# Altium footprint library 13-IC Packages-2smt2e.PcbLib: 86 footprints (part 4 of 6)
Each footprint in its own frame and in the unit in brackets; x right, y up, seen from the top. Pads: shape width x height; smd on the part's side, far side on the other; paste and mask are expansions set on the pad; w line width, h text height; cw(c..) or ccw(c..) is an arc to the next point about the centre after c.
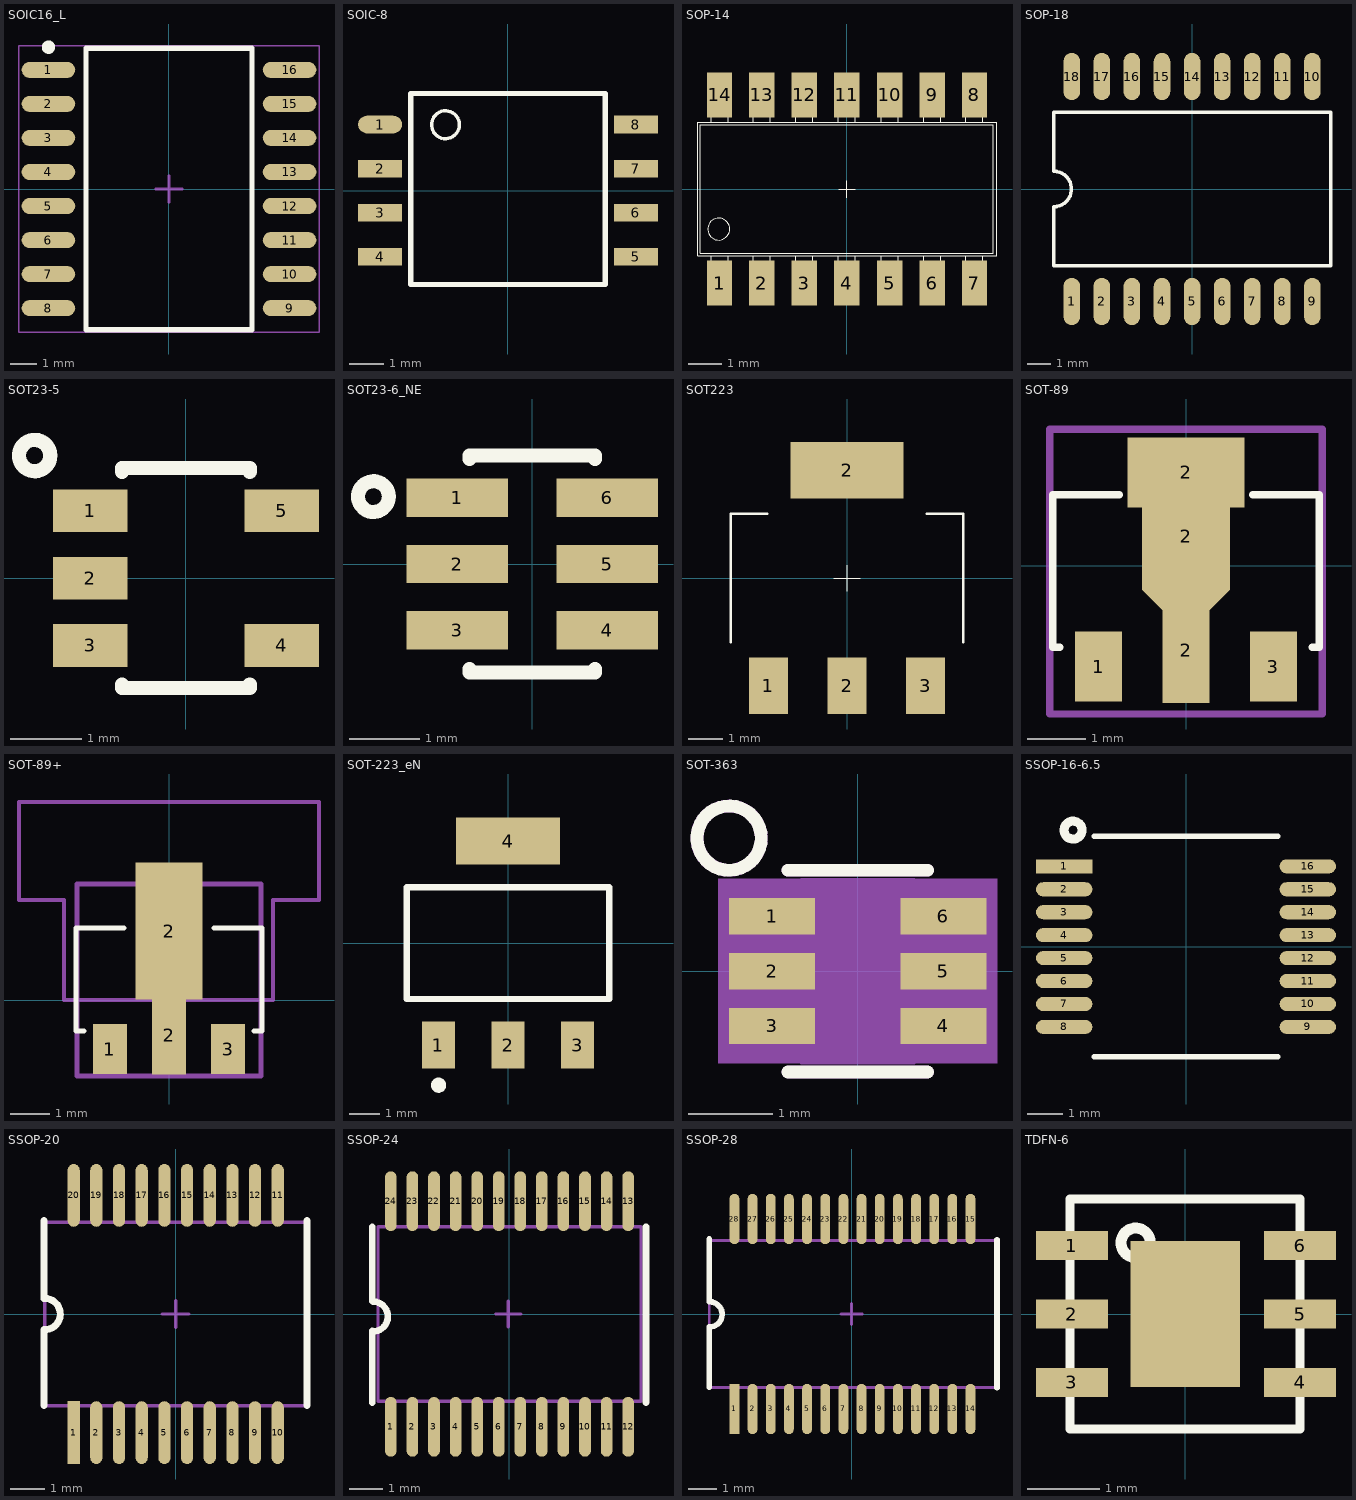
[diagram p3: the footprints below, top view; thin cyan lines are the x and y axes]

## SOIC16_L [mm]
pads (16):
  oval 2x0.6 smd: 1(-4.5,4.445) 2(-4.5,3.175) 3(-4.5,1.905) 4(-4.5,0.635) 5(-4.5,-0.635) 6(-4.5,-1.905) 7(-4.5,-3.175) 8(-4.5,-4.445) 9(4.5,-4.445) 10(4.5,-3.175) 11(4.5,-1.905) 12(4.5,-0.635) 13(4.5,0.635) 14(4.5,1.905) 15(4.5,3.175) 16(4.5,4.445)
Top Overlay:
  circle w0.25: c-4.5,5.295 r0.125
  lines w0.2: -3.1,-5.25 -3.1,5.25 3.1,5.25 3.1,-5.25 -3.1,-5.25
Mechanical 15:
  lines w0.05: -5.6,-5.35 -5.6,5.35 5.6,5.35 5.6,-5.35 -5.6,-5.35
  lines w0.1: -0.5,0 0.5,0 ; 0,-0.5 0,0.5
3D body "0_6-2_0.stp": height 0.02, standoff 0, extent 3.5,4.145 5.5,4.745
3D body "0_6-2_0.stp": height 0.02, standoff 0, extent 3.5,2.875 5.5,3.475
3D body "0_6-2_0.stp": height 0.02, standoff 0, extent 3.5,1.605 5.5,2.205
3D body "0_6-2_0.stp": height 0.02, standoff 0, extent 3.5,0.335 5.5,0.935
3D body "0_6-2_0.stp": height 0.02, standoff 0, extent 3.5,-0.935 5.5,-0.335
3D body "0_6-2_0.stp": height 0.02, standoff 0, extent 3.5,-2.205 5.5,-1.605
3D body "0_6-2_0.stp": height 0.02, standoff 0, extent 3.5,-3.475 5.5,-2.875
3D body "0_6-2_0.stp": height 0.02, standoff 0, extent 3.5,-4.745 5.5,-4.145
3D body "0_6-2_0.stp": height 0.02, standoff 0, extent -5.5,-4.745 -3.5,-4.145
3D body "0_6-2_0.stp": height 0.02, standoff 0, extent -5.5,-3.475 -3.5,-2.875
3D body "0_6-2_0.stp": height 0.02, standoff 0, extent -5.5,-2.205 -3.5,-1.605
3D body "0_6-2_0.stp": height 0.02, standoff 0, extent -5.5,-0.935 -3.5,-0.335
3D body "0_6-2_0.stp": height 0.02, standoff 0, extent -5.5,0.335 -3.5,0.935
3D body "0_6-2_0.stp": height 0.02, standoff 0, extent -5.5,1.605 -3.5,2.205
3D body "0_6-2_0.stp": height 0.02, standoff 0, extent -5.5,2.875 -3.5,3.475
3D body "0_6-2_0.stp": height 0.02, standoff 0, extent -5.5,4.145 -3.5,4.745
3D body "sop-16.stp": height 1.5, standoff 0, extent -4.067,-5 4.067,5

## SOIC-8 [mil]
pads (8):
  oval 50x20 smd mask+2: 1(-145,75)
  rect 50x20 smd mask+2: 2(-145,25) 3(-145,-25) 5(145,-75) 6(145,-25) 7(145,25) 8(145,75)
  rect 50x20 smd mask+0: 4(-145,-75)
Top Overlay:
  circle w3.94: c-70.87,74.8 r15.75
  lines w6: -110.24,-106.3 110.24,-106.3 110.24,110.24 -73.77,110.24 -110.24,110.24 -110.24,-106.3
3D body "soic-8.stp": height 68.9, standoff 0, extent -149.61,-99.61 153.54,102.36

## SOP-14 [mm]
pads (14):
  rect 0.76x1.35 smd mask+0.051: 1(-3.82,-2.819) 2(-2.55,-2.819) 3(-1.28,-2.819) 4(-0.01,-2.819) 5(1.28,-2.819) 6(2.55,-2.819) 7(3.82,-2.819) 8(3.82,2.819) 9(2.55,2.819) 10(1.28,2.819) 11(-0.01,2.819) 12(-1.28,2.819) 13(-2.55,2.819) 14(-3.82,2.819)
Top Overlay:
  circle w0.025: c-3.845,-1.2 r0.33
  lines w0.003: -0.249,0 0.244,0 ; 0,-0.269 0,0.244
  lines w0.025: -4.074,-2.591 -3.566,-2.591 ; -4.074,-2.007 -4.074,-3.099 -3.566,-3.099 -3.566,-2.007 ; -4.074,2.007 -4.074,3.099 -3.566,3.099 -3.566,2.007 ; -4.074,2.591 -3.566,2.591 ; -2.804,-2.591 -2.296,-2.591 ; -2.804,-2.007 -2.804,-3.099 -2.296,-3.099 -2.296,-2.007 ; -2.804,2.007 -2.804,3.099 -2.296,3.099 -2.296,2.007 ; -2.804,2.591 -2.296,2.591 ; -1.534,-2.591 -1.026,-2.591 ; -1.534,-2.007 -1.534,-3.099 -1.026,-3.099 -1.026,-2.007 ; -1.534,2.007 -1.534,3.099 -1.026,3.099 -1.026,2.007 ; -1.534,2.591 -1.026,2.591 ; -0.264,-2.591 0.244,-2.591 ; -0.264,-2.007 -0.264,-3.099 0.244,-3.099 0.244,-2.007 ; -0.264,2.019 -0.264,3.111 0.244,3.111 0.244,2.019 ; -0.264,2.603 0.244,2.603 ; 0.632,-2.007 4.485,-2.007 4.485,2.007 0.632,2.007 ; 0.638,-2.007 -4.468,-2.007 -4.468,2.007 0.638,2.007 ; 1.026,-2.591 1.534,-2.591 ; 1.026,-2.007 1.026,-3.099 1.534,-3.099 1.534,-2.007 ; 1.026,2.007 1.026,3.099 1.534,3.099 1.534,2.007 ; 1.026,2.591 1.534,2.591 ; 2.296,-2.591 2.804,-2.591 ; 2.296,-2.007 2.296,-3.099 2.804,-3.099 2.804,-2.007 ; 2.296,2.007 2.296,3.099 2.804,3.099 2.804,2.007 ; 2.296,2.591 2.804,2.591 ; 3.566,-2.591 4.074,-2.591 ; 3.566,-2.007 3.566,-3.099 4.074,-3.099 4.074,-2.007 ; 3.566,2.007 3.566,3.099 4.074,3.099 4.074,2.007 ; 3.566,2.591 4.074,2.591 ; -4.391,-1.93 -4.391,1.93 0.708,1.93 4.385,1.93 4.385,-1.93 0.562,-1.93 -4.391,-1.93
3D body "sop-14.stp": height 1.5, standoff -0.08, extent -4.315,-3.1 4.385,3.112

## SOP-18 [mm]
pads (18):
  oval 0.7x2 smd: 1(-5.08,-4.75) 2(-3.81,-4.75) 3(-2.54,-4.75) 4(-1.27,-4.75) 5(0,-4.75) 6(1.27,-4.75) 7(2.54,-4.75) 8(3.81,-4.75) 9(5.08,-4.75) 10(5.08,4.75) 11(3.81,4.75) 12(2.54,4.75) 13(1.27,4.75) 14(0,4.75) 15(-1.27,4.75) 16(-2.54,4.75) 17(-3.81,4.75) 18(-5.08,4.75)
Top Overlay:
  lines w0.15: -5.842,-3.25 -5.842,-0.75 ccw(c-5.842,0) -5.842,0.75 -5.842,3.25 5.867,3.25 5.867,-3.25 -5.842,-3.25
3D body "sop-18.stp": height 2.36, standoff -0.03, extent -5.677,-4.995 5.677,4.996

## SOT23-5 [mm]
pads (5):
  rect 1.05x0.6 smd mask+0.07: 1(-1.35,0.95) 2(-1.35,0) 3(-1.35,-0.95) 4(1.35,-0.95) 5(1.35,0.95)
Top Overlay:
  circle w0.2: c-2.134,1.727 r0.22
  lines w0.2: -0.9,-1.5 -0.9,-1.55 0.9,-1.55 0.9,-1.5 ; -0.9,1.5 -0.9,1.55 0.9,1.55 0.9,1.5
3D body "0_55-1_45.stp": height 0.02, standoff 0, extent 0.35,0.675 1.8,1.225
3D body "0_55-1_45.stp": height 0.02, standoff 0, extent 0.35,-1.225 1.8,-0.675
3D body "0_55-1_45.stp": height 0.02, standoff 0, extent -1.8,-1.225 -0.35,-0.675
3D body "0_55-1_45.stp": height 0.02, standoff 0, extent -1.8,-0.275 -0.35,0.275
3D body "0_55-1_45.stp": height 0.02, standoff 0, extent -1.8,0.675 -0.35,1.225
3D body "tsot-23-5.stp": height 1, standoff 0.01, extent -1.475,-1.45 1.475,1.45

## SOT23-6_NE [mm]
pads (6):
  rect 1.45x0.55 smd: 1(-1.075,0.95)
  rect 1.45x0.55 smd mask+0.07: 2(-1.075,0) 3(-1.075,-0.95) 4(1.075,-0.95) 5(1.075,0) 6(1.075,0.95)
Top Overlay:
  circle w0.2: c-2.274,0.965 r0.22
  lines w0.2: -0.9,-1.5 -0.9,-1.55 0.9,-1.55 0.9,-1.5 ; -0.9,1.5 -0.9,1.55 0.9,1.55 0.9,1.5
3D body "smd6.stp": height 1.1, standoff 0, extent -1.4,-1.45 1.4,1.45
3D body "0_55-1_45.stp": height 0.02, standoff 0, extent -1.8,0.675 -0.35,1.225
3D body "0_55-1_45.stp": height 0.02, standoff 0, extent -1.8,-0.275 -0.35,0.275
3D body "0_55-1_45.stp": height 0.02, standoff 0, extent -1.8,-1.225 -0.35,-0.675
3D body "0_55-1_45.stp": height 0.02, standoff 0, extent 0.35,-1.225 1.8,-0.675
3D body "0_55-1_45.stp": height 0.02, standoff 0, extent 0.35,-0.275 1.8,0.275
3D body "0_55-1_45.stp": height 0.02, standoff 0, extent 0.35,0.675 1.8,1.225

## SOT223 [mm]
height 1
pads (4):
  rect 1.14x1.65 smd mask+0.051: 1(-2.3,-3.15) 2(0,-3.15) 3(2.3,-3.15)
  rect 3.3x1.65 smd mask+0.051: 2(0,3.15)
Top Overlay:
  lines w0.005: -0.381,0 0.381,0 ; 0,-0.381 0,0.381
  lines w0.076: -3.4,-1.879 -3.4,1.879 -2.337,1.879 ; 2.337,1.879 3.4,1.879 3.4,-1.879
3D body "sot-233_to261aa.stp": height 1.8, standoff 0, extent -3.25,-3.5 3.25,3.5

## SOT-89 [mm]
pads (5):
  rect 0.8x1.2 smd: 1(-1.499,-1.727) 3(1.499,-1.727)
  rect 0.8x1.8 smd: 2(0,-1.448)
  oct 1.5x2.6 smd: 2(0,0.508)
  rect 2x1.2 smd: 2(0,1.6)
Top Overlay:
  lines w0.127: -2.159,-1.397 -2.286,-1.397 -2.286,1.219 -1.143,1.219 ; 1.143,1.219 2.286,1.219 2.286,-1.397 2.159,-1.397
Mechanical 15:
  lines w0.127: -2.337,-2.54 -2.337,2.337 2.337,2.337 2.337,-2.54 -2.337,-2.54
3D body "sot89pad.stp": height 0, standoff 0, extent -0.279,1.35 0.991,2.21
3D body "sot89pad.stp": height 0, standoff 0, extent -0.991,1.348 0.279,2.208
3D body "sot89pad.stp": height 0, standoff 0, extent 1.069,-2.337 1.929,-1.067
3D body "sot89pad.stp": height 0, standoff 0, extent -0.455,-2.387 0.405,-1.117
3D body "sot89pad.stp": height 0, standoff 0, extent -1.928,-2.362 -1.068,-1.092
3D body "sot-89.stp": height 1.5, standoff 0, extent -2.25,-2.101 2.25,1.899

## SOT-89+ [mm]
pads (4):
  rect 0.86x1.27 smd: 1(-1.5,-1.25) 3(1.5,-1.25)
  rect 0.86x2 smd: 2(0,-0.889)
  rect 1.7x3.48 smd: 2(0,1.753)
Top Overlay:
  lines w0.127: -2.159,-0.787 -2.362,-0.787 -2.362,1.829 -1.143,1.829 ; 1.143,1.829 2.362,1.829 2.362,-0.787 2.159,-0.787
Mechanical 15:
  lines w0.127: -2.337,-1.93 -2.337,2.946 2.337,2.946 2.337,-1.93 -2.337,-1.93
Mechanical 16:
  lines w0.1: -3.81,2.54 -3.81,5.029 3.81,5.029 3.81,2.54 2.642,2.54 2.642,0 -2.667,0 -2.667,2.54 -3.81,2.54
3D body "sot89pad.stp": height 0, standoff 0, extent -0.024,2.21 0.836,3.48
3D body "sot89pad.stp": height 0, standoff 0, extent -0.836,2.21 0.023,3.48
3D body "sot89pad.stp": height 0, standoff 0, extent 1.069,-1.879 1.929,-0.609
3D body "sot89pad.stp": height 0, standoff 0, extent -0.43,-1.905 0.43,-0.635
3D body "sot89pad.stp": height 0, standoff 0, extent -1.928,-1.879 -1.069,-0.609
3D body "sot-89.stp": height 1.5, standoff 0, extent -2.25,-1.491 2.25,2.509

## SOT-223_eN [mm]
height 1.7
pads (4):
  rect 1.1x1.55 smd mask+0.07: 1(-2.3,-3.375) 2(0,-3.375) 3(2.3,-3.375)
  rect 3.45x1.55 smd: 4(0,3.375)
Top Overlay:
  circle w0.25: c-2.3,-4.7 r0.125
  lines w0.2: -3.35,-1.85 3.35,-1.85 3.35,1.85 -3.35,1.85 -3.35,-1.85
3D body "1_1-1_55.stp": height 0.02, standoff 0, extent 1.75,-4.15 2.85,-2.6
3D body "1_1-1_55.stp": height 0.02, standoff 0, extent -0.55,-4.15 0.55,-2.6
3D body "1_1-1_55.stp": height 0.02, standoff 0, extent -2.85,-4.15 -1.75,-2.6
3D body "3_45-1_55.stp": height 0.02, standoff 0, extent -1.725,2.6 1.725,4.15
3D body "sot-233_to261aa.stp": height 1.8, standoff 0, extent -3.263,-3.5 3.237,3.5

## SOT-363 [mil]
pads (6):
  rect 40x17 smd: 1(-40,25.59) 2(-40,0) 3(-40,-25.59) 4(40,-25.59) 5(40,0) 6(40,25.59)
Top Overlay:
  circle w6: c-60,62.09 r15
  lines w6: -32.5,-47.09 32.5,-47.09 ; -32.5,47.09 32.5,47.09
Mechanical 6:
  lines w6: -32.5,-47.09 32.5,-47.09 ; -32.5,47.09 32.5,47.09 ; -75,62.09 cw(c-60,62.09) -60,77.09 cw(c-60,62.09) -45,62.09 cw(c-60,62.09) -60,47.09 cw(c-60,62.09) -75,62.09
Mechanical 16:
  region: -65,-43 65,-43 65,43 -65,43
  lines w1: -26.5,-43 -26.5,43 26.5,43 26.5,-43 -26.5,-43
Mechanical 18:
  text "5" at 50,10 h25
  text "4" at 50,-15 h25
3D body "sot363.stp": height 43.31, standoff -0.47, extent -40.37,-39.37 40.34,39.37
3D body "sot363pad.stp": height 0.08, standoff 0, extent 19.99,-34.08 59.99,-17.09
3D body "sot363pad.stp": height 0.08, standoff 0, extent 19.99,-8.49 59.99,8.51
3D body "sot363pad.stp": height 0.08, standoff 0, extent 19.99,17.1 59.99,34.1
3D body "sot363pad.stp": height 0.08, standoff 0, extent -60.01,-34.08 -20.01,-17.09
3D body "sot363pad.stp": height 0.08, standoff 0, extent -60.01,-8.49 -20.01,8.51
3D body "sot363pad.stp": height 0.08, standoff 0, extent -60.01,17.1 -20.01,34.1

## SSOP-16-6.5 [mm]
pads (16):
  rect 1.6x0.4 smd: 1(-3.45,2.275)
  oval 1.6x0.4 smd mask+0.07: 2(-3.45,1.625) 3(-3.45,0.975) 4(-3.45,0.325) 5(-3.45,-0.325) 6(-3.45,-0.975) 7(-3.45,-1.625) 8(-3.45,-2.275) 9(3.45,-2.275) 10(3.45,-1.625) 11(3.45,-0.975) 12(3.45,-0.325) 13(3.45,0.325) 14(3.45,0.975) 15(3.45,1.625) 16(3.45,2.275)
Top Overlay:
  circle w0.254: c-3.2,3.302 r0.254
  lines w0.152: -2.6,-3.124 2.6,-3.124 ; -2.6,3.124 2.6,3.124
3D body "ssop-16.stp": height 1.73, standoff -0.01, extent -3.826,-3.035 3.826,3.035
3D body "2-0_4.stp": height 0.02, standoff 0, extent 2.25,-2.475 4.25,-2.075
3D body "2-0_4.stp": height 0.02, standoff 0, extent 2.25,-1.825 4.25,-1.425
3D body "2-0_4.stp": height 0.02, standoff 0, extent 2.25,-1.175 4.25,-0.775
3D body "2-0_4.stp": height 0.02, standoff 0, extent 2.25,-0.525 4.25,-0.125
3D body "2-0_4.stp": height 0.02, standoff 0, extent 2.25,0.125 4.25,0.525
3D body "2-0_4.stp": height 0.02, standoff 0, extent 2.25,0.775 4.25,1.175
3D body "2-0_4.stp": height 0.02, standoff 0, extent 2.25,1.425 4.25,1.825
3D body "2-0_4.stp": height 0.02, standoff 0, extent 2.25,2.075 4.25,2.475
3D body "2-0_4.stp": height 0.02, standoff 0, extent -4.25,-2.475 -2.25,-2.075
3D body "2-0_4.stp": height 0.02, standoff 0, extent -4.25,-1.825 -2.25,-1.425
3D body "2-0_4.stp": height 0.02, standoff 0, extent -4.25,-1.175 -2.25,-0.775
3D body "2-0_4.stp": height 0.02, standoff 0, extent -4.25,-0.525 -2.25,-0.125
3D body "2-0_4.stp": height 0.02, standoff 0, extent -4.25,0.125 -2.25,0.525
3D body "2-0_4.stp": height 0.02, standoff 0, extent -4.25,0.775 -2.25,1.175
3D body "2-0_4.stp": height 0.02, standoff 0, extent -4.25,1.425 -2.25,1.825
3D body "2-0_4.stp": height 0.02, standoff 0, extent -4.25,2.075 -2.25,2.475

## SSOP-20 [mm]
pads (20):
  rect 0.35x1.8 smd: 1(-2.925,-3.4)
  oval 0.35x1.8 smd mask+0.07: 2(-2.275,-3.4) 3(-1.625,-3.4) 4(-0.975,-3.4) 5(-0.325,-3.4) 6(0.325,-3.4) 7(0.975,-3.4) 8(1.625,-3.4) 9(2.275,-3.4) 10(2.925,-3.4) 11(2.925,3.4) 12(2.275,3.4) 13(1.625,3.4) 14(0.975,3.4) 15(0.325,3.4) 16(-0.325,3.4) 17(-0.975,3.4) 18(-1.625,3.4) 19(-2.275,3.4) 20(-2.925,3.4)
Top Overlay:
  lines w0.2: -3.776,-2.622 -3.776,-0.463 ; -3.776,0.437 -3.776,2.683 ; -3.772,-0.45 ccw(c-3.759,0) -3.746,0.45 ; 3.759,-2.616 3.759,2.684
Mechanical 15:
  lines w0.1: -0.385,0 0.377,0 ; -0.004,-0.381 -0.004,0.381 ; -3.759,-2.629 3.785,-2.629 3.785,2.629 -3.759,2.629 -3.759,-2.629
3D body "ssop-20.stp": height 2, standoff 0.04, extent -3.6,-3.9 3.6,3.9
3D body "1_8-0_35.stp": height 0.02, standoff 0, extent 2.745,-4.302 3.095,-2.502
3D body "1_8-0_35.stp": height 0.02, standoff 0, extent 2.097,-4.302 2.447,-2.502
3D body "1_8-0_35.stp": height 0.02, standoff 0, extent 1.449,-4.293 1.799,-2.493
3D body "1_8-0_35.stp": height 0.02, standoff 0, extent 0.802,-4.302 1.152,-2.502
3D body "1_8-0_35.stp": height 0.02, standoff 0, extent 0.141,-4.302 0.491,-2.502
3D body "1_8-0_35.stp": height 0.02, standoff 0, extent -0.506,-4.302 -0.156,-2.502
3D body "1_8-0_35.stp": height 0.02, standoff 0, extent -1.154,-4.302 -0.804,-2.502
3D body "1_8-0_35.stp": height 0.02, standoff 0, extent -1.802,-4.302 -1.452,-2.502
3D body "1_8-0_35.stp": height 0.02, standoff 0, extent -2.462,-4.302 -2.112,-2.502
3D body "1_8-0_35.stp": height 0.02, standoff 0, extent -3.11,-4.302 -2.76,-2.502
3D body "1_8-0_35.stp": height 0.02, standoff 0, extent -3.11,2.505 -2.76,4.305
3D body "1_8-0_35.stp": height 0.02, standoff 0, extent -2.449,2.505 -2.1,4.305
3D body "1_8-0_35.stp": height 0.02, standoff 0, extent -1.802,2.505 -1.452,4.305
3D body "1_8-0_35.stp": height 0.02, standoff 0, extent -1.154,2.505 -0.804,4.305
3D body "1_8-0_35.stp": height 0.02, standoff 0, extent -0.506,2.505 -0.156,4.305
3D body "1_8-0_35.stp": height 0.02, standoff 0, extent 0.141,2.505 0.491,4.305
3D body "1_8-0_35.stp": height 0.02, standoff 0, extent 0.802,2.505 1.152,4.305
3D body "1_8-0_35.stp": height 0.02, standoff 0, extent 1.449,2.505 1.799,4.305
3D body "1_8-0_35.stp": height 0.02, standoff 0, extent 2.097,2.505 2.447,4.305
3D body "1_8-0_35.stp": height 0.02, standoff 0, extent 2.745,2.505 3.095,4.305

## SSOP-24 [mm]
pads (24):
  oval 0.35x1.8 smd mask+0.07: 1(-3.575,-3.4) 2(-2.925,-3.4) 3(-2.275,-3.4) 4(-1.625,-3.4) 5(-0.975,-3.4) 6(-0.325,-3.4) 7(0.325,-3.4) 8(0.975,-3.4) 9(1.625,-3.4) 10(2.275,-3.4) 11(2.925,-3.4) 12(3.575,-3.4) 13(3.575,3.4) 14(2.925,3.4) 15(2.275,3.4) 16(1.625,3.4) 17(0.975,3.4) 18(0.325,3.4) 19(-0.325,3.4) 20(-0.975,3.4) 21(-1.625,3.4) 22(-2.275,3.4) 23(-2.925,3.4) 24(-3.575,3.4)
Top Overlay:
  lines w0.2: -4.137,-2.673 -4.137,-0.513 ; -4.137,0.386 -4.137,2.633 ; -4.128,-0.526 ccw(c-4.115,-0.076) -4.102,0.374 ; 4.115,-2.667 4.115,2.633
Mechanical 15:
  lines w0.1: -0.415,0 0.347,0 ; -0.034,-0.381 -0.034,0.381 ; -3.962,-2.629 -3.962,2.629 3.962,2.629 3.962,-2.629 -3.962,-2.629
3D body "ssop-24.stp": height 2.13, standoff -0.04, extent -3.975,-3.7 3.925,3.7
3D body "1_8-0_35.stp": height 0.02, standoff 0, extent 3.401,2.505 3.751,4.305
3D body "1_8-0_35.stp": height 0.02, standoff 0, extent 2.753,2.505 3.103,4.305
3D body "1_8-0_35.stp": height 0.02, standoff 0, extent 2.093,2.505 2.442,4.305
3D body "1_8-0_35.stp": height 0.02, standoff 0, extent 1.445,2.505 1.795,4.305
3D body "1_8-0_35.stp": height 0.02, standoff 0, extent 0.797,2.505 1.147,4.305
3D body "1_8-0_35.stp": height 0.02, standoff 0, extent 0.149,2.505 0.499,4.305
3D body "1_8-0_35.stp": height 0.02, standoff 0, extent -0.498,2.505 -0.148,4.305
3D body "1_8-0_35.stp": height 0.02, standoff 0, extent -1.159,2.505 -0.809,4.305
3D body "1_8-0_35.stp": height 0.02, standoff 0, extent -1.806,2.505 -1.456,4.305
3D body "1_8-0_35.stp": height 0.02, standoff 0, extent -2.454,2.505 -2.104,4.305
3D body "1_8-0_35.stp": height 0.02, standoff 0, extent -3.102,2.505 -2.752,4.305
3D body "1_8-0_35.stp": height 0.02, standoff 0, extent -3.749,2.505 -3.4,4.305
3D body "1_8-0_35.stp": height 0.02, standoff 0, extent -3.762,-4.302 -3.412,-2.502
3D body "1_8-0_35.stp": height 0.02, standoff 0, extent -3.102,-4.302 -2.752,-2.502
3D body "1_8-0_35.stp": height 0.02, standoff 0, extent -2.454,-4.302 -2.104,-2.502
3D body "1_8-0_35.stp": height 0.02, standoff 0, extent -1.806,-4.302 -1.456,-2.502
3D body "1_8-0_35.stp": height 0.02, standoff 0, extent -1.159,-4.302 -0.809,-2.502
3D body "1_8-0_35.stp": height 0.02, standoff 0, extent -0.498,-4.302 -0.148,-2.502
3D body "1_8-0_35.stp": height 0.02, standoff 0, extent 0.149,-4.293 0.499,-2.493
3D body "1_8-0_35.stp": height 0.02, standoff 0, extent 0.797,-4.302 1.147,-2.502
3D body "1_8-0_35.stp": height 0.02, standoff 0, extent 1.445,-4.302 1.795,-2.502
3D body "1_8-0_35.stp": height 0.02, standoff 0, extent 2.105,-4.302 2.455,-2.502
3D body "1_8-0_35.stp": height 0.02, standoff 0, extent 2.753,-4.305 3.103,-2.505
3D body "1_8-0_35.stp": height 0.02, standoff 0, extent 3.401,-4.302 3.751,-2.502

## SSOP-28 [mm]
pads (28):
  rect 0.35x1.8 smd: 1(-4.191,-3.4)
  oval 0.35x1.8 smd mask+0.07: 2(-3.541,-3.4) 3(-2.891,-3.4) 4(-2.241,-3.4) 5(-1.591,-3.4) 6(-0.941,-3.4) 7(-0.291,-3.4) 8(0.359,-3.4) 9(1.009,-3.4) 10(1.659,-3.4) 11(2.309,-3.4) 12(2.959,-3.4) 13(3.609,-3.4) 14(4.259,-3.4) 15(4.259,3.4) 16(3.609,3.4) 17(2.959,3.4) 18(2.309,3.4) 19(1.659,3.4) 20(1.009,3.4) 21(0.359,3.4) 22(-0.291,3.4) 23(-0.941,3.4) 24(-1.591,3.4) 25(-2.241,3.4) 26(-2.891,3.4) 27(-3.541,3.4) 28(-4.191,3.4)
Top Overlay:
  lines w0.2: -5.093,-2.622 -5.093,-0.463 ccw(c-5.08,-0.013) -5.067,0.437 ; -5.093,0.437 -5.093,2.683 ; 5.207,-2.646 5.207,2.654
Mechanical 15:
  lines w0.1: -0.381,0 0.381,0 ; 0,-0.381 0,0.381 ; -5.093,-2.629 -5.093,2.629 5.207,2.629 5.207,-2.629 -5.093,-2.629
3D body "ssop28.stp": height 1.65, standoff 0, extent -4.896,-3.7 5.004,3.7
3D body "1_8-0_35.stp": height 0.02, standoff 0, extent 4.079,2.504 4.429,4.304
3D body "1_8-0_35.stp": height 0.02, standoff 0, extent 3.435,2.505 3.785,4.305
3D body "1_8-0_35.stp": height 0.02, standoff 0, extent 2.787,2.505 3.137,4.305
3D body "1_8-0_35.stp": height 0.02, standoff 0, extent 2.127,2.505 2.476,4.305
3D body "1_8-0_35.stp": height 0.02, standoff 0, extent 1.479,2.505 1.829,4.305
3D body "1_8-0_35.stp": height 0.02, standoff 0, extent 0.831,2.505 1.181,4.305
3D body "1_8-0_35.stp": height 0.02, standoff 0, extent 0.183,2.505 0.533,4.305
3D body "1_8-0_35.stp": height 0.02, standoff 0, extent -0.464,2.505 -0.114,4.305
3D body "1_8-0_35.stp": height 0.02, standoff 0, extent -1.125,2.505 -0.775,4.305
3D body "1_8-0_35.stp": height 0.02, standoff 0, extent -1.772,2.505 -1.422,4.305
3D body "1_8-0_35.stp": height 0.02, standoff 0, extent -2.42,2.505 -2.07,4.305
3D body "1_8-0_35.stp": height 0.02, standoff 0, extent -3.068,2.505 -2.718,4.305
3D body "1_8-0_35.stp": height 0.02, standoff 0, extent -3.715,2.505 -3.365,4.305
3D body "1_8-0_35.stp": height 0.02, standoff 0, extent -4.376,2.505 -4.026,4.305
3D body "1_8-0_35.stp": height 0.02, standoff 0, extent -4.376,-4.302 -4.026,-2.502
3D body "1_8-0_35.stp": height 0.02, standoff 0, extent -3.728,-4.302 -3.378,-2.502
3D body "1_8-0_35.stp": height 0.02, standoff 0, extent -3.068,-4.302 -2.718,-2.502
3D body "1_8-0_35.stp": height 0.02, standoff 0, extent -2.42,-4.302 -2.07,-2.502
3D body "1_8-0_35.stp": height 0.02, standoff 0, extent -1.772,-4.302 -1.422,-2.502
3D body "1_8-0_35.stp": height 0.02, standoff 0, extent -1.125,-4.302 -0.775,-2.502
3D body "1_8-0_35.stp": height 0.02, standoff 0, extent -0.464,-4.302 -0.114,-2.502
3D body "1_8-0_35.stp": height 0.02, standoff 0, extent 0.183,-4.293 0.533,-2.493
3D body "1_8-0_35.stp": height 0.02, standoff 0, extent 0.831,-4.302 1.181,-2.502
3D body "1_8-0_35.stp": height 0.02, standoff 0, extent 1.479,-4.302 1.829,-2.502
3D body "1_8-0_35.stp": height 0.02, standoff 0, extent 2.139,-4.302 2.489,-2.502
3D body "1_8-0_35.stp": height 0.02, standoff 0, extent 2.787,-4.305 3.137,-2.505
3D body "1_8-0_35.stp": height 0.02, standoff 0, extent 3.435,-4.302 3.785,-2.502
3D body "1_8-0_35.stp": height 0.02, standoff 0, extent 4.082,-4.302 4.432,-2.502

## TDFN-6 [mm] "3X3"
pads (7):
  rect 1x0.4 smd mask+0.051: 1(-1.575,0.953) 3(-1.575,-0.953) 4(1.6,-0.953) 5(1.6,0) 6(1.6,0.953)
  rect 1x0.4 smd mask+0: 2(-1.575,0)
  rect 1.524x2.032 smd mask+0: ""(0,0)
Top Overlay:
  circle w0.152: c-0.687,0.991 r0.205
  lines w0.127: -1.6,-1.6 1.6,-1.6 1.6,1.6 -0.318,1.6 -1.6,1.6 -1.6,-1.6
3D body "tdfn-6.stp": height 0.7, standoff -0.02, extent -1.501,-1.5 1.499,1.5